# Altium footprint library module.PcbLib: 4 footprints
Each footprint in its own frame and in the unit in brackets; x right, y up, seen from the top. Pads: shape width x height; smd on the part's side, far side on the other; paste and mask are expansions set on the pad; w line width, h text height; cw(c..) or ccw(c..) is an arc to the next point about the centre after c.
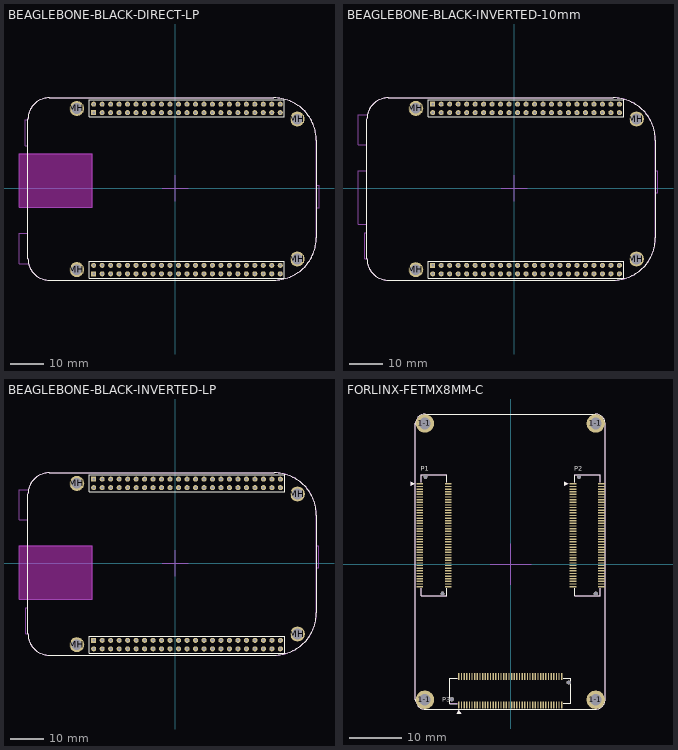
[diagram p0: the footprints below, top view; thin cyan lines are the x and y axes]

## BEAGLEBONE-BLACK-DIRECT-LP [mil]
pads (96):
  rect 60x60 hole 30 mask+2: 1-1(-962.2,-1010.07)
  round 60 hole 30 mask+2: 1-2(-962.2,-910.07) 1-3(-862.2,-1010.07) 1-4(-862.2,-910.07) 1-5(-762.2,-1010.07) 1-6(-762.2,-910.07) 1-7(-662.2,-1010.07) 1-8(-662.2,-910.07) 1-9(-562.2,-1010.07) 1-10(-562.2,-910.07) 1-11(-462.2,-1010.07) 1-12(-462.2,-910.07) 1-13(-362.2,-1010.07) 1-14(-362.2,-910.07) 1-15(-262.2,-1010.07) 1-16(-262.2,-910.07) 1-17(-162.2,-1010.07) 1-18(-162.2,-910.07) 1-19(-62.2,-1010.07) 1-20(-62.2,-910.07) 1-21(37.8,-1010.07) 1-22(37.8,-910.07) 1-23(137.8,-1010.07) 1-24(137.8,-910.07) 1-25(237.8,-1010.07) 1-26(237.8,-910.07) 1-27(337.8,-1010.07) 1-28(337.8,-910.07) 1-29(437.8,-1010.07) 1-30(437.8,-910.07) 1-31(537.8,-1010.07) 1-32(537.8,-910.07) 1-33(637.8,-1010.07) 1-34(637.8,-910.07) 1-35(737.8,-1010.07) 1-36(737.8,-910.07) 1-37(837.8,-1010.07) 1-38(837.8,-910.07) 1-39(937.8,-1010.07) 1-40(937.8,-910.07) 1-41(1037.8,-1010.07) 1-42(1037.8,-910.07) 1-43(1137.8,-1010.07) 1-44(1137.8,-910.07) 1-45(1237.8,-1010.07) 1-46(1237.8,-910.07) 2-3(-862.2,889.93) 2-4(-862.2,989.93) 2-5(-762.2,889.93) 2-6(-762.2,989.93) 2-7(-662.2,889.93) 2-8(-662.2,989.93) 2-9(-562.2,889.93) 2-10(-562.2,989.93) 2-11(-462.2,889.93) 2-12(-462.2,989.93) 2-13(-362.2,889.93) 2-14(-362.2,989.93) 2-16(-262.2,989.93) 2-17(-162.2,889.93) 2-18(-162.2,989.93) 2-19(-62.2,889.93) 2-20(-62.2,989.93) 2-21(37.8,889.93) 2-22(37.8,989.93) 2-23(137.8,889.93) 2-24(137.8,989.93) 2-25(237.8,889.93) 2-26(237.8,989.93) 2-27(337.8,889.93) 2-28(337.8,989.93) 2-29(437.8,889.93) 2-30(437.8,989.93) 2-31(537.8,889.93) 2-32(537.8,989.93) 2-33(637.8,889.93) 2-34(637.8,989.93) 2-35(737.8,889.93) 2-36(737.8,989.93) 2-37(837.8,889.93) 2-38(837.8,989.93) 2-39(937.8,889.93) 2-40(937.8,989.93) 2-41(1037.8,889.93) 2-42(1037.8,989.93) 2-43(1137.8,889.93) 2-44(1137.8,989.93) 2-45(1237.8,889.93) 2-46(1237.8,989.93)
  rect 60x60 hole 30 mask+2.01: 2-1(-962.2,889.93)
  round 60 hole 30 mask+2.01: 2-2(-962.2,989.93) 2-15(-262.2,889.93)
  round 175 hole 125: MH(-1161.06,-960.47) MH(-1161.06,939.53) MH(1438.94,-835.47) MH(1438.94,814.53)
Top Overlay:
  lines w1: -1012.2,-1060.07 -1012.2,-860.07 -912.2,-860.07 1287.8,-860.07 1287.8,-1060.07 -912.2,-1060.07 -1012.2,-1060.07 ; -1012.2,839.93 -1012.2,1039.93 -912.2,1039.93 1287.8,1039.93 1287.8,839.93 -912.2,839.93 -1012.2,839.93
  lines w7.87: -1736.91,814.87 cw(c-1487.2,814.82) -1487.14,1064.53 ; -1736.85,814.76 -1736.86,-834.2 ccw(c-1486.34,-834.2) -1486.34,-1084.71 1162.8,-1084.71 ccw(c1162.8,-585.07) 1662.44,-585.07 1662.44,564.93 ; -1487.2,1064.53 1162.8,1064.53 cw(c1162.8,564.93) 1662.4,564.93
Keep-Out Layer:
  board cut-out: -1842.51,-226.4 -978.66,-226.4 -978.66,402.72 -1842.51,402.72
Mechanical 1:
  lines w3.94: -1737.21,814.93 cw(c-1487.21,814.93) -1487.21,1064.93 ; -1736.74,-834.2 -1736.74,817.38 ; -1736.34,-834.2 ccw(c-1486.34,-834.2) -1486.34,-1084.2 ; -1493.23,-1084.51 1162.8,-1084.5 ; -1487.2,1064.82 1162.8,1064.82 ; 1162.79,-1085.07 ccw(c1162.79,-585.07) 1662.79,-585.07 ; 1162.79,1064.93 cw(c1162.79,564.93) 1662.79,564.93 ; 1662.67,-604.87 1662.67,564.93
Mechanical 15:
  lines w3.94: -1737.17,-530.85 -1840.34,-530.85 -1840.34,-893.12 -1729.4,-893.12 ; -1736.48,-530.85 -1736.48,-226.4 ; -1729.4,-893.23 ccw(c-1485.91,-834.33) -1485.91,-1084.84 1163.23,-1084.84 ccw(c1163.23,-585.2) 1662.87,-585.2 1662.87,-228.97 1694.76,-228.97 1694.76,34.98 1662.87,34.98 1662.87,564.8 ccw(c1163.23,564.8) 1163.23,1064.4 -1486.77,1064.4 ; -1486.71,1064.4 ccw(c-1486.77,814.69) -1736.48,814.74 -1736.48,806.63 -1766.57,806.63 -1766.57,497.81 -1736.48,497.81 -1736.48,402.72 ; -152.99,0 152.98,0 ; 0.01,-152.98 0.01,152.98 ; -1842.49,402.72 -1736.48,402.72 ; -1842.5,402.72 -1842.5,-226.4 -1736.48,-226.4 ; -1842.5,402.72 -1842.49,402.72 ; -1736.48,-226.4 -978.66,-226.4 -978.66,402.72 -1736.48,402.72
3D body "BeagleBone-Black PCBA - STEP.STEP": height 90.31, standoff -659.2, extent -1840.45,-1086.61 1690.85,1063.38
3D body "TSW-123-07-F-D.stp": height 100, standoff -330, extent -1011.81,839.53 1288.19,1039.53
3D body "TSW-123-07-F-D.stp": height 100, standoff -330, extent -1011.81,-1060.47 1288.19,-860.47

## BEAGLEBONE-BLACK-INVERTED-10mm [mil]
pads (96):
  rect 60x60 hole 30 mask+2.01: 1-1(-962.2,989.93)
  round 60 hole 30 mask+2.01: 1-2(-962.2,889.93) 2-46(1237.8,-1010.07)
  round 60 hole 30 mask+2: 1-3(-862.2,989.93) 1-4(-862.2,889.93) 1-5(-762.2,989.93) 1-6(-762.2,889.93) 1-7(-662.2,989.93) 1-8(-662.2,889.93) 1-9(-562.2,989.93) 1-10(-562.2,889.93) 1-11(-462.2,989.93) 1-12(-462.2,889.93) 1-13(-362.2,989.93) 1-14(-362.2,889.93) 1-15(-262.2,989.93) 1-16(-262.2,889.93) 1-17(-162.2,989.93) 1-18(-162.2,889.93) 1-19(-62.2,989.93) 1-20(-62.2,889.93) 1-21(37.8,989.93) 1-22(37.8,889.93) 1-23(137.8,989.93) 1-24(137.8,889.93) 1-25(237.8,989.93) 1-26(237.8,889.93) 1-27(337.8,989.93) 1-28(337.8,889.93) 1-29(437.8,989.93) 1-30(437.8,889.93) 1-31(537.8,989.93) 1-32(537.8,889.93) 1-33(637.8,989.93) 1-34(637.8,889.93) 1-35(737.8,989.93) 1-36(737.8,889.93) 1-37(837.8,989.93) 1-38(837.8,889.93) 1-39(937.8,989.93) 1-40(937.8,889.93) 1-41(1037.8,989.93) 1-42(1037.8,889.93) 1-43(1137.8,989.93) 1-44(1137.8,889.93) 1-45(1237.8,989.93) 1-46(1237.8,889.93) 2-2(-962.2,-1010.07) 2-3(-862.2,-910.07) 2-4(-862.2,-1010.07) 2-5(-762.2,-910.07) 2-6(-762.2,-1010.07) 2-7(-662.2,-910.07) 2-8(-662.2,-1010.07) 2-9(-562.2,-910.07) 2-10(-562.2,-1010.07) 2-11(-462.2,-910.07) 2-12(-462.2,-1010.07) 2-13(-362.2,-910.07) 2-14(-362.2,-1010.07) 2-15(-262.2,-910.07) 2-16(-262.2,-1010.07) 2-17(-162.2,-910.07) 2-18(-162.2,-1010.07) 2-19(-62.2,-910.07) 2-20(-62.2,-1010.07) 2-21(37.8,-910.07) 2-22(37.8,-1010.07) 2-23(137.8,-910.07) 2-24(137.8,-1010.07) 2-25(237.8,-910.07) 2-26(237.8,-1010.07) 2-27(337.8,-910.07) 2-28(337.8,-1010.07) 2-29(437.8,-910.07) 2-30(437.8,-1010.07) 2-31(537.8,-910.07) 2-32(537.8,-1010.07) 2-33(637.8,-910.07) 2-34(637.8,-1010.07) 2-35(737.8,-910.07) 2-36(737.8,-1010.07) 2-37(837.8,-910.07) 2-38(837.8,-1010.07) 2-39(937.8,-910.07) 2-40(937.8,-1010.07) 2-41(1037.8,-910.07) 2-42(1037.8,-1010.07) 2-43(1137.8,-910.07) 2-44(1137.8,-1010.07) 2-45(1237.8,-910.07)
  rect 60x60 hole 30 mask+2: 2-1(-962.2,-910.07)
  round 175 hole 125: MH(-1161.06,-960.47) MH(-1161.06,939.53) MH(1438.94,-835.47) MH(1438.94,814.53)
Top Overlay:
  lines w1: -1012.2,-1060.07 -912.2,-1060.07 1287.8,-1060.07 1287.8,-860.07 -912.2,-860.07 -1012.2,-860.07 -1012.2,-1060.07 ; -1012.2,839.93 -912.2,839.93 1287.8,839.93 1287.8,1039.93 -912.2,1039.93 -1012.2,1039.93 -1012.2,839.93
  lines w7.87: -1736.91,814.87 cw(c-1487.2,814.82) -1487.14,1064.53 ; -1736.85,814.76 -1736.86,-834.2 ccw(c-1486.34,-834.2) -1486.34,-1084.71 1162.8,-1084.71 ccw(c1162.8,-585.07) 1662.44,-585.07 1662.44,564.93 ; -1487.2,1064.53 1162.8,1064.53 cw(c1162.8,564.93) 1662.4,564.93
Mechanical 1:
  lines w3.94: -1737.21,814.93 cw(c-1487.21,814.93) -1487.21,1064.93 ; -1736.74,-834.2 -1736.74,817.38 ; -1736.34,-834.2 ccw(c-1486.34,-834.2) -1486.34,-1084.2 ; -1493.23,-1084.51 1162.8,-1084.5 ; -1487.2,1064.82 1162.8,1064.82 ; 1162.79,-1085.07 ccw(c1162.79,-585.07) 1662.79,-585.07 ; 1162.79,1064.93 cw(c1162.79,564.93) 1662.79,564.93 ; 1662.67,-604.87 1662.67,564.93
Mechanical 15:
  lines w3.94: -1731.01,867.67 -1734.86,867.67 ; -1731,867.7 cw(c-1486.36,813.78) -1486.36,1064.29 1162.78,1064.29 cw(c1162.78,564.65) 1662.42,564.65 1662.42,203.31 1692.84,203.31 1692.84,-56.57 1662.42,-56.57 1662.42,-585.35 cw(c1162.78,-585.35) 1162.78,-1084.95 -1487.22,-1084.95 ; -1487.16,-1084.95 cw(c-1487.22,-835.24) -1736.93,-835.29 -1736.93,-830.76 -1764.16,-830.76 -1764.16,-523.54 -1736.93,-523.54 -1736.93,-425.98 -1842.52,-425.98 -1842.52,203.18 -1736.93,203.18 -1736.93,509.15 -1838.18,509.15 -1838.18,867.67 -1734.74,867.67 ; -152.99,0.01 152.98,0.01 ; 0,-153.54 0,152.42 ; -1734.86,867.67 -1734.74,867.67 ; -1734.86,867.67 -1734.74,867.67
3D body "BeagleBone-Black PCBA - STEP.STEP": height 942.67, standoff 193.16, extent -1840.45,-1086.61 1690.85,1063.38
3D body "54112-106461000LF.stp": height 649.61, standoff -94.88, extent -1012.2,-1055.7 1287.8,-865.55
3D body "54112-106461000LF.stp": height 649.61, standoff -94.88, extent -1012.02,844.59 1287.98,1034.74

## BEAGLEBONE-BLACK-INVERTED-LP [mil]
pads (96):
  rect 60x60 hole 30 mask+2.01: 1-1(-962.2,989.93)
  round 60 hole 30 mask+2.01: 1-2(-962.2,889.93) 2-46(1237.8,-1010.07)
  round 60 hole 30 mask+2: 1-3(-862.2,989.93) 1-4(-862.2,889.93) 1-5(-762.2,989.93) 1-6(-762.2,889.93) 1-7(-662.2,989.93) 1-8(-662.2,889.93) 1-9(-562.2,989.93) 1-10(-562.2,889.93) 1-11(-462.2,989.93) 1-12(-462.2,889.93) 1-13(-362.2,989.93) 1-14(-362.2,889.93) 1-15(-262.2,989.93) 1-16(-262.2,889.93) 1-17(-162.2,989.93) 1-18(-162.2,889.93) 1-19(-62.2,989.93) 1-20(-62.2,889.93) 1-21(37.8,989.93) 1-22(37.8,889.93) 1-23(137.8,989.93) 1-24(137.8,889.93) 1-25(237.8,989.93) 1-26(237.8,889.93) 1-27(337.8,989.93) 1-28(337.8,889.93) 1-29(437.8,989.93) 1-30(437.8,889.93) 1-31(537.8,989.93) 1-32(537.8,889.93) 1-33(637.8,989.93) 1-34(637.8,889.93) 1-35(737.8,989.93) 1-36(737.8,889.93) 1-37(837.8,989.93) 1-38(837.8,889.93) 1-39(937.8,989.93) 1-40(937.8,889.93) 1-41(1037.8,989.93) 1-42(1037.8,889.93) 1-43(1137.8,989.93) 1-44(1137.8,889.93) 1-45(1237.8,989.93) 1-46(1237.8,889.93) 2-2(-962.2,-1010.07) 2-3(-862.2,-910.07) 2-4(-862.2,-1010.07) 2-5(-762.2,-910.07) 2-6(-762.2,-1010.07) 2-7(-662.2,-910.07) 2-8(-662.2,-1010.07) 2-9(-562.2,-910.07) 2-10(-562.2,-1010.07) 2-11(-462.2,-910.07) 2-12(-462.2,-1010.07) 2-13(-362.2,-910.07) 2-14(-362.2,-1010.07) 2-15(-262.2,-910.07) 2-16(-262.2,-1010.07) 2-17(-162.2,-910.07) 2-18(-162.2,-1010.07) 2-19(-62.2,-910.07) 2-20(-62.2,-1010.07) 2-21(37.8,-910.07) 2-22(37.8,-1010.07) 2-23(137.8,-910.07) 2-24(137.8,-1010.07) 2-25(237.8,-910.07) 2-26(237.8,-1010.07) 2-27(337.8,-910.07) 2-28(337.8,-1010.07) 2-29(437.8,-910.07) 2-30(437.8,-1010.07) 2-31(537.8,-910.07) 2-32(537.8,-1010.07) 2-33(637.8,-910.07) 2-34(637.8,-1010.07) 2-35(737.8,-910.07) 2-36(737.8,-1010.07) 2-37(837.8,-910.07) 2-38(837.8,-1010.07) 2-39(937.8,-910.07) 2-40(937.8,-1010.07) 2-41(1037.8,-910.07) 2-42(1037.8,-1010.07) 2-43(1137.8,-910.07) 2-44(1137.8,-1010.07) 2-45(1237.8,-910.07)
  rect 60x60 hole 30 mask+2: 2-1(-962.2,-910.07)
  round 175 hole 125: MH(-1161.06,-960.47) MH(-1161.06,939.53) MH(1438.94,-835.47) MH(1438.94,814.53)
Top Overlay:
  lines w1: -1012.2,-1060.07 -912.2,-1060.07 1287.8,-1060.07 1287.8,-860.07 -912.2,-860.07 -1012.2,-860.07 -1012.2,-1060.07 ; -1012.2,839.93 -912.2,839.93 1287.8,839.93 1287.8,1039.93 -912.2,1039.93 -1012.2,1039.93 -1012.2,839.93
  lines w7.87: -1736.91,814.87 cw(c-1487.2,814.82) -1487.14,1064.53 ; -1736.85,814.76 -1736.86,-834.2 ccw(c-1486.34,-834.2) -1486.34,-1084.71 1162.8,-1084.71 ccw(c1162.8,-585.07) 1662.44,-585.07 1662.44,564.93 ; -1487.2,1064.53 1162.8,1064.53 cw(c1162.8,564.93) 1662.4,564.93
Keep-Out Layer:
  board cut-out: -1842.52,-425.94 -978.68,-425.94 -978.68,203.18 -1842.52,203.18
Mechanical 1:
  lines w3.94: -1737.21,814.93 cw(c-1487.21,814.93) -1487.21,1064.93 ; -1736.74,-834.2 -1736.74,817.38 ; -1736.34,-834.2 ccw(c-1486.34,-834.2) -1486.34,-1084.2 ; -1493.23,-1084.51 1162.8,-1084.5 ; -1487.2,1064.82 1162.8,1064.82 ; 1162.79,-1085.07 ccw(c1162.79,-585.07) 1662.79,-585.07 ; 1162.79,1064.93 cw(c1162.79,564.93) 1662.79,564.93 ; 1662.67,-604.87 1662.67,564.93
Mechanical 15:
  lines w3.94: -1731.01,867.67 -1734.86,867.67 ; -1731,867.7 cw(c-1486.36,813.78) -1486.36,1064.29 1162.78,1064.29 cw(c1162.78,564.65) 1662.42,564.65 1662.42,203.31 1692.84,203.31 1692.84,-56.57 1662.42,-56.57 1662.42,-585.35 cw(c1162.78,-585.35) 1162.78,-1084.95 -1487.22,-1084.95 ; -1487.16,-1084.95 cw(c-1487.22,-835.24) -1736.93,-835.29 -1736.93,-830.76 -1764.16,-830.76 -1764.16,-523.54 -1736.93,-523.54 -1736.93,-425.98 ; -152.99,0.01 152.98,0.01 ; 0,-153.54 0,152.42 ; -1736.93,-425.98 -978.7,-425.98 -978.7,192.68 -978.7,203.18 -1736.93,203.18 ; -1736.93,-425.98 -1842.52,-425.98 -1842.52,203.18 -1736.93,203.18 ; -1736.93,203.18 -1736.93,509.15 -1838.18,509.15 -1838.18,867.67 -1734.74,867.67 ; -1734.86,867.67 -1734.74,867.67 ; -1734.86,867.67 -1734.74,867.67
3D body "TSW-123-07-F-D.stp": height 330, standoff -100, extent -1011.81,-1060.47 1288.19,-860.47
3D body "TSW-123-07-F-D.stp": height 330, standoff -100, extent -1011.81,839.53 1288.19,1039.53
3D body "BeagleBone-Black PCBA - STEP.STEP": height 659.2, standoff -90.31, extent -1840.45,-1086.61 1690.85,1063.38

## FORLINX-FETMX8MM-C [mm]
pads (244):
  rect 1.3x0.25 smd mask+0.05: 1-1(-17.25,15.258) 1-2(-11.85,15.258) 1-3(-17.25,14.758) 1-4(-11.85,14.758) 1-5(-17.25,14.258) 1-6(-11.85,14.258) 1-7(-17.25,13.758) 1-8(-11.85,13.758) 1-9(-17.25,13.258) 1-10(-11.85,13.258) 1-11(-17.25,12.758) 1-12(-11.85,12.758) 1-13(-17.25,12.258) 1-14(-11.85,12.258) 1-15(-17.25,11.758) 1-16(-11.85,11.758) 1-17(-17.25,11.258) 1-18(-11.85,11.258) 1-19(-17.25,10.758) 1-20(-11.85,10.758) 1-21(-17.25,10.258) 1-22(-11.85,10.258) 1-23(-17.25,9.758) 1-24(-11.85,9.758) 1-25(-17.25,9.258) 1-26(-11.85,9.258) 1-27(-17.25,8.758) 1-28(-11.85,8.758) 1-29(-17.25,8.258) 1-30(-11.85,8.258) 1-31(-17.25,7.758) 1-32(-11.85,7.758) 1-33(-17.25,7.258) 1-34(-11.85,7.258) 1-35(-17.25,6.758) 1-36(-11.85,6.758) 1-37(-17.25,6.258) 1-38(-11.85,6.258) 1-39(-17.25,5.758) 1-40(-11.85,5.758) 1-41(-17.25,5.258) 1-42(-11.85,5.258) 1-43(-17.25,4.758) 1-44(-11.85,4.758) 1-45(-17.25,4.258) 1-46(-11.85,4.258) 1-47(-17.25,3.758) 1-48(-11.85,3.758) 1-49(-17.25,3.258) 1-50(-11.85,3.258) 1-51(-17.25,2.758) 1-52(-11.85,2.758) 1-53(-17.25,2.258) 1-54(-11.85,2.258) 1-55(-17.25,1.758) 1-56(-11.85,1.758) 1-57(-17.25,1.258) 1-58(-11.85,1.258) 1-59(-17.25,0.758) 1-60(-11.85,0.758) 1-61(-17.25,0.258) 1-62(-11.85,0.258) 1-63(-17.25,-0.242) 1-64(-11.85,-0.242) 1-65(-17.25,-0.742) 1-66(-11.85,-0.742) 1-67(-17.25,-1.242) 1-68(-11.85,-1.242) 1-69(-17.25,-1.742) 1-70(-11.85,-1.742) 1-71(-17.25,-2.242) 1-72(-11.85,-2.242) 1-73(-17.25,-2.742) 1-74(-11.85,-2.742) 1-75(-17.25,-3.242) 1-76(-11.85,-3.242) 1-77(-17.25,-3.742) 1-78(-11.85,-3.742) 1-79(-17.25,-4.242) 1-80(-11.85,-4.242) 2-1(11.85,15.258) 2-2(17.25,15.258) 2-3(11.85,14.758) 2-4(17.25,14.758) 2-5(11.85,14.258) 2-6(17.25,14.258) 2-7(11.85,13.758) 2-8(17.25,13.758) 2-9(11.85,13.258) 2-10(17.25,13.258) 2-11(11.85,12.758) 2-12(17.25,12.758) 2-13(11.85,12.258) 2-14(17.25,12.258) 2-15(11.85,11.758) 2-16(17.25,11.758) 2-17(11.85,11.258) 2-18(17.25,11.258) 2-19(11.85,10.758) 2-20(17.25,10.758) 2-21(11.85,10.258) 2-22(17.25,10.258) 2-23(11.85,9.758) 2-24(17.25,9.758) 2-25(11.85,9.258) 2-26(17.25,9.258) 2-27(11.85,8.758) 2-28(17.25,8.758) 2-29(11.85,8.258) 2-30(17.25,8.258) 2-31(11.85,7.758) 2-32(17.25,7.758) 2-33(11.85,7.258) 2-34(17.25,7.258) 2-35(11.85,6.758) 2-36(17.25,6.758) 2-37(11.85,6.258) 2-38(17.25,6.258) 2-39(11.85,5.758) 2-40(17.25,5.758) 2-41(11.85,5.258) 2-42(17.25,5.258) 2-43(11.85,4.758) 2-44(17.25,4.758) 2-45(11.85,4.258) 2-46(17.25,4.258) 2-47(11.85,3.758) 2-48(17.25,3.758) 2-49(11.85,3.258) 2-50(17.25,3.258) 2-51(11.85,2.758) 2-52(17.25,2.758) 2-53(11.85,2.258) 2-54(17.25,2.258) 2-55(11.85,1.758) 2-56(17.25,1.758) 2-57(11.85,1.258) 2-58(17.25,1.258) 2-59(11.85,0.758) 2-60(17.25,0.758) 2-61(11.85,0.258) 2-62(17.25,0.258) 2-63(11.85,-0.242) 2-64(17.25,-0.242) 2-65(11.85,-0.742) 2-66(17.25,-0.742) 2-67(11.85,-1.242) 2-68(17.25,-1.242) 2-69(11.85,-1.742) 2-70(17.25,-1.742) 2-71(11.85,-2.242) 2-72(17.25,-2.242) 2-73(11.85,-2.742) 2-74(17.25,-2.742) 2-75(11.85,-3.242) 2-76(17.25,-3.242) 2-77(11.85,-3.742) 2-78(17.25,-3.742) 2-79(11.85,-4.242) 2-80(17.25,-4.242)
  round 3.5 hole 2.2: 1-1(-16.267,-25.692) 1-1(-16.267,26.708) 1-1(16.133,-25.692) 1-1(16.133,26.708)
  rect 0.25x1.3 smd mask+0.05: 3-1(-9.817,-26.708) 3-2(-9.817,-21.308) 3-3(-9.317,-26.708) 3-4(-9.317,-21.308) 3-5(-8.817,-26.708) 3-6(-8.817,-21.308) 3-7(-8.317,-26.708) 3-8(-8.317,-21.308) 3-9(-7.817,-26.708) 3-10(-7.817,-21.308) 3-11(-7.317,-26.708) 3-12(-7.317,-21.308) 3-13(-6.817,-26.708) 3-14(-6.817,-21.308) 3-15(-6.317,-26.708) 3-16(-6.317,-21.308) 3-17(-5.817,-26.708) 3-18(-5.817,-21.308) 3-19(-5.317,-26.708) 3-20(-5.317,-21.308) 3-21(-4.817,-26.708) 3-22(-4.817,-21.308) 3-23(-4.317,-26.708) 3-24(-4.317,-21.308) 3-25(-3.817,-26.708) 3-26(-3.817,-21.308) 3-27(-3.317,-26.708) 3-28(-3.317,-21.308) 3-29(-2.817,-26.708) 3-30(-2.817,-21.308) 3-31(-2.317,-26.708) 3-32(-2.317,-21.308) 3-33(-1.817,-26.708) 3-34(-1.817,-21.308) 3-35(-1.317,-26.708) 3-36(-1.317,-21.308) 3-37(-0.817,-26.708) 3-38(-0.817,-21.308) 3-39(-0.317,-26.708) 3-40(-0.317,-21.308) 3-41(0.183,-26.708) 3-42(0.183,-21.308) 3-43(0.683,-26.708) 3-44(0.683,-21.308) 3-45(1.183,-26.708) 3-46(1.183,-21.308) 3-47(1.683,-26.708) 3-48(1.683,-21.308) 3-49(2.183,-26.708) 3-50(2.183,-21.308) 3-51(2.683,-26.708) 3-52(2.683,-21.308) 3-53(3.183,-26.708) 3-54(3.183,-21.308) 3-55(3.683,-26.708) 3-56(3.683,-21.308) 3-57(4.183,-26.708) 3-58(4.183,-21.308) 3-59(4.683,-26.708) 3-60(4.683,-21.308) 3-61(5.183,-26.708) 3-62(5.183,-21.308) 3-63(5.683,-26.708) 3-64(5.683,-21.308) 3-65(6.183,-26.708) 3-66(6.183,-21.308) 3-67(6.683,-26.708) 3-68(6.683,-21.308) 3-69(7.183,-26.708) 3-70(7.183,-21.308) 3-71(7.683,-26.708) 3-72(7.683,-21.308) 3-73(8.183,-26.708) 3-74(8.183,-21.308) 3-75(8.683,-26.708) 3-76(8.683,-21.308) 3-77(9.183,-26.708) 3-78(9.183,-21.308) 3-79(9.683,-26.708) 3-80(9.683,-21.308)
via 11.033,-22.408 diameter 0.8 hole 0.8
via -11.167,-25.608 diameter 0.8 hole 0.8
via -16.15,16.608 diameter 0.8 hole 0.8
via -12.95,-5.592 diameter 0.8 hole 0.8
via 12.95,16.608 diameter 0.8 hole 0.8
via 16.15,-5.592 diameter 0.8 hole 0.8
Top Overlay:
  region: -10.217,-28.398 -9.417,-28.398 -9.817,-27.658
  region: -18.94,15.658 -18.94,14.858 -18.2,15.258
  region: 10.16,15.658 10.16,14.858 10.9,15.258
  lines w0.2: -18.067,-25.692 -18.067,26.708 ; -18.067,-25.592 ccw(c-16.167,-25.592) -16.167,-27.491 ; -18.067,26.608 cw(c-16.167,26.608) -16.167,28.508 ; -16.95,15.558 -16.95,17.008 -12.15,17.008 -12.15,15.558 ; -16.937,-4.542 -16.937,-5.992 -12.137,-5.992 -12.137,-4.542 ; -16.267,-27.492 16.133,-27.492 ; -16.267,28.508 16.15,28.508 ; -10.117,-26.408 -11.567,-26.408 -11.567,-21.608 -10.117,-21.608 ; 9.983,-26.395 11.433,-26.395 11.433,-21.595 9.983,-21.595 ; 12.15,15.558 12.15,17.008 16.95,17.008 16.95,15.558 ; 12.163,-4.542 12.163,-5.992 16.963,-5.992 16.963,-4.542 ; 16.033,-27.492 ccw(c16.033,-25.592) 17.933,-25.592 ; 16.05,28.508 cw(c16.033,26.608) 17.933,26.608 ; 17.933,-25.692 17.933,26.708
  text "P3" at -12.969,-26.5 h1.52
  text "P2" at 12.05,17.35 h1.52
  text "P1" at -17.05,17.35 h1.52
Mechanical 1:
  region: -10.217,-28.396 -9.417,-28.396 -9.817,-27.656
  region: -18.94,15.66 -18.94,14.86 -18.2,15.26
  region: 10.16,15.66 10.16,14.86 10.9,15.26
  lines w0.1: -18.067,-25.69 -18.067,26.71 ; -18.067,-25.59 ccw(c-16.167,-25.59) -16.167,-27.489 ; -18.067,26.61 cw(c-16.167,26.61) -16.167,28.51 ; -16.95,15.56 -16.95,17.01 -12.15,17.01 -12.15,15.56 ; -16.937,-4.54 -16.937,-5.99 -12.137,-5.99 -12.137,-4.54 ; -16.267,-27.49 16.133,-27.49 ; -16.267,28.51 16.15,28.51 ; -10.117,-26.406 -11.567,-26.406 -11.567,-21.606 -10.117,-21.606 ; 9.983,-26.393 11.433,-26.393 11.433,-21.593 9.983,-21.593 ; 12.15,15.56 12.15,17.01 16.95,17.01 16.95,15.56 ; 12.163,-4.54 12.163,-5.99 16.963,-5.99 16.963,-4.54 ; 16.033,-27.49 ccw(c16.033,-25.59) 17.933,-25.59 ; 16.05,28.51 cw(c16.033,26.61) 17.933,26.61 ; 17.933,-25.69 17.933,26.71
  text "P3" at -12.969,-26.498 h1.52
  text "P2" at 12.05,17.352 h1.52
  text "P1" at -17.05,17.352 h1.52
Mechanical 15:
  lines w0.1: -18.067,-25.692 -18.067,26.708 ; -18.067,-25.592 ccw(c-16.167,-25.592) -16.167,-27.492 ; -18.067,26.608 cw(c-16.167,26.608) -16.167,28.508 ; -16.267,-27.492 16.133,-27.492 ; -16.267,28.508 16.15,28.508 ; -3.886,0 3.886,0 ; 0,-3.886 0,3.886 ; 16.033,-27.492 ccw(c16.033,-25.592) 17.933,-25.592 ; 16.05,28.508 cw(c16.033,26.608) 17.933,26.608 ; 17.933,-25.692 17.933,26.708
3D body "User Library-axk5f80537yg.STEP": height 1.87, standoff -0.3, extent -17.25,-6 -11.85,17
3D body "User Library-axk5f80537yg.STEP": height 1.87, standoff -0.3, extent 11.85,-6 17.25,17
3D body "User Library-axk5f80537yg.STEP": height 1.87, standoff -0.3, extent -11.565,-26.707 11.435,-21.307